# Altium footprint library cool_library.PcbLib: 1182 footprints (part 54 of 75)
Each footprint in its own frame and in the unit in brackets; x right, y up, seen from the top. Pads: shape width x height; smd on the part's side, far side on the other; paste and mask are expansions set on the pad; w line width, h text height; cw(c..) or ccw(c..) is an arc to the next point about the centre after c.
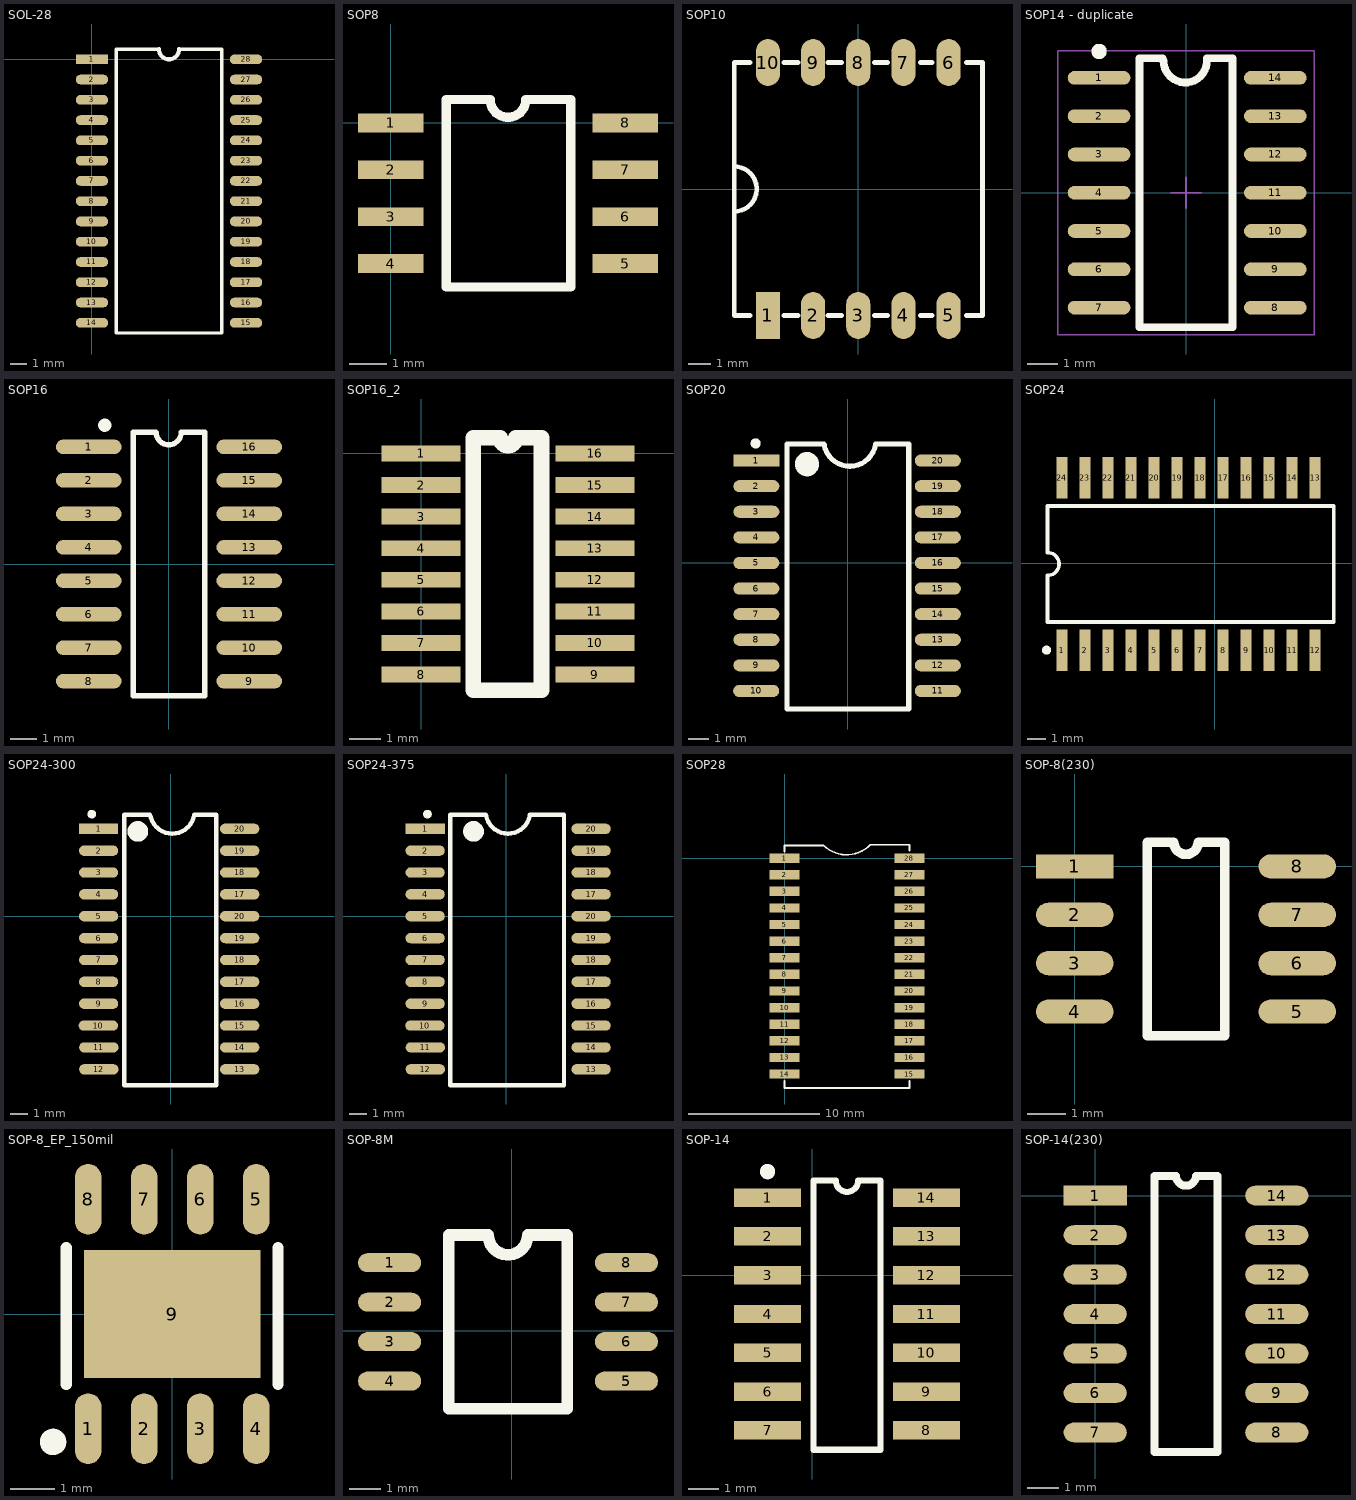
[diagram p53: the footprints below, top view; thin cyan lines are the x and y axes]

## SOL-28 [mil]
pads (28):
  rect 80x24 smd: 1(0,0)
  oval 80x24 smd: 2(0,-50) 3(0,-100) 4(0,-150) 5(0,-200) 6(0,-250) 7(0,-300) 8(0,-350) 9(0,-400) 10(0,-450) 11(0,-500) 12(0,-550) 13(0,-600) 14(0,-650) 15(380,-650) 16(380,-600) 17(380,-550) 18(380,-500) 19(380,-450) 20(380,-400) 21(380,-350) 22(380,-300) 23(380,-250) 24(380,-200) 25(380,-150) 26(380,-100) 27(380,-50) 28(380,0)
Top Overlay:
  lines w8: 165,25 60,25 60,-675 320,-675 320,25 215,25
  lines w10: 165,25 ccw(c190,25) 215,25

## SOP8 [mil]
pads (8):
  rect 70x20 smd: 1(0,0) 2(0,-50) 3(0,-100) 4(0,-150) 5(250,-150) 6(250,-100) 7(250,-50) 8(250,0)
Top Overlay:
  lines w10: 144,25 cw(c125,25) 106,25 59,25 59,-175 192,-175 192,25 145,25
3D body: height 80, standoff 10, extent 56,-176 192,27

## SOP10 [mil]
height 80
pads (10):
  rect 42x82 smd: 1(-157.48,-220.47)
  oval 42x82 smd: 2(-78.74,-220.47) 3(0,-220.47) 4(78.74,-220.47) 5(157.48,-220.47) 6(157.48,220.47) 7(78.74,220.47) 8(0,220.47) 9(-78.74,220.47) 10(-157.48,220.47)
Top Overlay:
  lines w8: -216.54,-39.37 ccw(c-216.54,0) -216.54,39.37 ; -188,-220.47 -216.54,-220.47 -216.54,220.47 -188,220.47 ; -130,-220.47 -105,-220.47 ; -130,220.47 -105,220.47 ; -53,-220.47 -29,-220.47 ; -53,220.47 -29,220.47 ; 28,-220.47 51,-220.47 ; 28,220.47 51,220.47 ; 108,-220.47 129,-220.47 ; 108,220.47 129,220.47 ; 188,-220.47 216.54,-220.47 216.54,220.47 188,220.47

## SOP14 - duplicate [mm] "LM339"
height 1.8
pads (14):
  oval 2.05x0.45 smd: 1(-2.845,3.759) 2(-2.845,2.506) 3(-2.845,1.253) 4(-2.845,0) 5(-2.845,-1.253) 6(-2.845,-2.506) 7(-2.845,-3.759) 8(2.921,-3.759) 9(2.921,-2.506) 10(2.921,-1.253) 11(2.921,0) 12(2.921,1.253) 13(2.921,2.506) 14(2.921,3.759)
Top Overlay:
  circle w0.25: c-2.843,4.623 r0.125
  lines w0.254: -0.762,4.4 -1.525,4.4 -1.525,-4.4 1.525,-4.4 1.525,4.4 0.686,4.4 ; -0.737,4.318 ccw(c-0.025,4.318) 0.685,4.342
Mechanical 15:
  lines w0.051: -0.5,0 0.5,0 ; 0,-0.5 0,0.5 ; -4.2,-4.65 4.2,-4.65 4.2,4.65 -4.2,4.65 -4.2,-4.65
3D body: height 1.61, standoff 0, extent -3.151,-4.376 3.049,4.324

## SOP16 [mm] "SOP, 16-Leads, Body 9.90x3.90mm, Pitch 1.27mm, IPC Medium Density"
height 1.75
pads (16):
  oval 2.5x0.55 smd: 1(-3.035,4.445) 2(-3.035,3.175) 3(-3.035,1.905) 4(-3.035,0.635) 5(-3.035,-0.635) 6(-3.035,-1.905) 7(-3.035,-3.175) 8(-3.035,-4.445) 9(3.06,-4.445) 10(3.06,-3.175) 11(3.06,-1.905) 12(3.06,-0.635) 13(3.06,0.635) 14(3.06,1.905) 15(3.06,3.175) 16(3.06,4.445)
Top Overlay:
  circle w0.25: c-2.425,5.27 r0.125
  lines w0.2: -0.483,5 -1.346,5 -1.346,-5 1.372,-5 1.372,5 0.475,5 ; -0.475,4.997 ccw(c0,4.996) 0.475,4.997
3D body: height 1.8, standoff -0.2, extent -3.986,-5.1 3.935,5.1

## SOP16_2 [mm]
pads (16):
  rect 2.5x0.5 smd: 1(0,0) 2(0,-1) 3(0,-2) 4(0,-3) 5(0,-4) 6(0,-5) 7(0,-6) 8(0,-7) 9(5.5,-7) 10(5.5,-6) 11(5.5,-5) 12(5.5,-4) 13(5.5,-3) 14(5.5,-2) 15(5.5,-1) 16(5.5,0)
Top Overlay:
  lines w0.5: 1.651,-7.5 1.651,0.5 2.5,0.5 ccw(c2.75,0.5) 3,0.5 3.81,0.5 3.81,-7.5 1.651,-7.5

## SOP20 [mm]
height 2.36
pads (20):
  rect 2.286x0.6 smd: 1(-4.534,5.08)
  oval 2.286x0.6 smd: 2(-4.534,3.81) 3(-4.534,2.54) 4(-4.534,1.27) 5(-4.534,0) 6(-4.534,-1.27) 7(-4.534,-2.54) 8(-4.534,-3.81) 9(-4.534,-5.08) 10(-4.544,-6.35) 11(4.465,-6.35) 12(4.465,-5.08) 13(4.465,-3.81) 14(4.465,-2.54) 15(4.465,-1.27) 16(4.465,0) 17(4.465,1.27) 18(4.465,2.54) 19(4.465,3.81) 20(4.465,5.08)
Top Overlay:
  circle w0.6: c-2.025,4.9 r0.3
  circle w0.25: c-4.575,5.93 r0.125
  lines w0.254: -1.194,5.9 -3.025,5.9 -3.025,-7.239 3.025,-7.239 3.025,5.9 1.372,5.9 ; -1.17,5.844 ccw(c0.101,6.094) 1.372,5.842
3D body: height 2.7, standoff 0, extent -5.15,-7.009 5.15,5.791

## SOP24 [mm]
pads (24):
  rect 0.6x2.3 smd: 1(-8.444,-4.785) 2(-7.174,-4.785) 3(-5.904,-4.785) 4(-4.634,-4.785) 5(-3.364,-4.785) 6(-2.094,-4.785) 7(-0.824,-4.785) 8(0.446,-4.785) 9(1.716,-4.785) 10(2.986,-4.785) 11(4.256,-4.785) 12(5.526,-4.785) 13(5.526,4.715) 14(4.256,4.715) 15(2.986,4.715) 16(1.716,4.715) 17(0.446,4.715) 18(-0.824,4.715) 19(-2.094,4.715) 20(-3.364,4.715) 21(-4.634,4.715) 22(-5.904,4.715) 23(-7.174,4.715) 24(-8.444,4.715)
Top Overlay:
  circle w0.25: c-9.294,-4.785 r0.125
  lines w0.2: -9.239,-3.235 6.55,-3.235 6.55,3.165 -9.239,3.165 -9.239,0.6 cw(c-9.239,-0.035) -9.239,-0.67 -9.239,-3.235

## SOP24-300 [mil]
height 92.91
pads (24):
  rect 90x23.62 smd: 1(-164.5,200)
  oval 90x23.62 smd: 2(-164.5,150) 3(-164.5,100) 4(-164.5,50) 5(-164.5,0) 6(-164.5,-50) 7(-164.5,-100) 8(-164.5,-150) 9(-164.5,-200) 10(-164.9,-250) 11(-164,-300) 12(-164,-350) 13(158,-350) 14(158,-300) 15(158,-250) 16(158,-200) 17(158,-150) 17(158,50) 18(158,-100) 18(158,100) 19(158,-50) 19(158,150) 20(158,0) 20(158,200)
Top Overlay:
  circle w9.84: c-180.12,233.46 r4.92
  circle w23.62: c-74.81,194 r11.81
  lines w10: -47,232.28 -106,232.28 -106,-386 105,-386 105,232.28 54,232.28 ; -46.07,230.07 ccw(c3.97,239.91) 54,230

## SOP24-375 [mil]
height 92.91
pads (24):
  rect 90x23.62 smd: 1(-185.5,200)
  oval 90x23.62 smd: 2(-185.5,150) 3(-185.5,100) 4(-185.5,50) 5(-185.5,0) 6(-185.5,-50) 7(-185.5,-100) 8(-185.5,-150) 9(-185.5,-200) 10(-185.9,-250) 11(-185,-300) 12(-185,-350) 13(194,-350) 14(194,-300) 15(194,-250) 16(194,-200) 17(194,-150) 17(194,50) 18(194,-100) 18(194,100) 19(194,-50) 19(194,150) 20(194,0) 20(194,200)
Top Overlay:
  circle w23.62: c-74.81,194 r11.81
  circle w9.84: c-180.12,233.46 r4.92
  lines w10: -47,232.28 -128,232.28 -128,-386 132,-386 132,232.28 54,232.28 ; -46.07,230.07 ccw(c3.97,239.91) 54,230
3D body: height 74.8, standoff 1.06, extent -203,-383.99 209,234

## SOP28 [mil]
pads (28):
  rect 90x28 smd: 1(0,0) 2(0,-50) 3(0,-100) 4(0,-150) 5(0,-200) 6(0,-250) 7(0,-300) 8(0,-350) 9(0,-400) 10(0,-450) 11(0,-500) 12(0,-550) 13(0,-600) 14(0,-650) 15(375.94,-650) 16(375.94,-600) 17(375.94,-550) 18(375.94,-500) 19(375.94,-450) 20(375.94,-400) 21(375.94,-350) 22(375.94,-300) 23(375.94,-250) 24(375.94,-200) 25(375.94,-150) 26(375.94,-100) 27(375.94,-50) 28(375.94,0)
Top Overlay:
  lines w5: 0,-670 0,-692 376,-692 376,-670 ; 0,20 0,38 118,38 ccw(c187,109) 258,40 376,40 376,22

## SOP-8(230) [mil]
pads (8):
  rect 80x25 smd: 1(0,0)
  oval 80x25 smd: 2(0,-50) 3(0,-100) 4(0,-150) 5(230,-150) 6(230,-100) 7(230,-50) 8(230,0)
Top Overlay:
  lines w10: 75,-175 75,25 102.5,25 ccw(c115,25) 127.5,25 155,25 155,-175 75,-175

## SOP-8_EP_150mil [mm]
height 8.23
pads (9):
  oval 0.6x1.6 smd: 1(-1.905,-2.6) 2(-0.635,-2.6) 3(0.635,-2.6) 4(1.905,-2.6) 5(1.905,2.6) 6(0.635,2.6) 7(-0.635,2.6) 8(-1.905,2.6)
  rect 4x2.9 smd: 9(0,0)
Top Overlay:
  circle w0.3: c-2.7,-2.9 r0.15
  lines w0.254: -2.4,-1.6 -2.4,1.5 ; 2.4,-1.6 2.4,1.5

## SOP-8M [mil]
pads (8):
  oval 80x24 smd: 1(-155,86) 2(-155,36) 3(-155,-14) 4(-155,-64) 5(145,-64) 6(145,-14) 7(145,36) 8(145,86)
Top Overlay:
  lines w15: -80,-99 -80,121 -30,121 ccw(c-5,121) 20,121 70,121 70,-99 -80,-99

## SOP-14 [mm]
pads (14):
  rect 2.2x0.6 smd: 1(-1.457,2.54) 2(-1.457,1.27) 3(-1.457,0) 4(-1.457,-1.27) 5(-1.457,-2.54) 6(-1.457,-3.81) 7(-1.457,-5.08) 8(3.743,-5.08) 9(3.743,-3.81) 10(3.743,-2.54) 11(3.743,-1.27) 12(3.743,0) 13(3.743,1.27) 14(3.743,2.54)
Top Overlay:
  circle w0.25: c-1.457,3.39 r0.125
  lines w0.2: 0.043,-5.715 2.243,-5.715 2.243,3.095 1.51,3.095 cw(c1.143,3.095) 0.776,3.095 0.043,3.095 0.043,-5.715

## SOP-14(230) [mil]
pads (14):
  rect 80x25 smd: 1(0,0)
  oval 80x25 smd: 2(0,-50) 3(0,-100) 4(0,-150) 5(0,-200) 6(0,-250) 7(0,-300) 8(230,-300) 9(230,-250) 10(230,-200) 11(230,-150) 12(230,-100) 13(230,-50) 14(230,0)
Top Overlay:
  lines w10: 75,-325 75,25 102.5,25 ccw(c115,25) 127.5,25 155,25 155,-325 75,-325